# Altium footprint library WR-TBL_Pluggable PCB Header.PcbLib: 719 footprints (part 14 of 45)
Each footprint in its own frame and in the unit in brackets; x right, y up, seen from the top. Pads: shape width x height; smd on the part's side, far side on the other; paste and mask are expansions set on the pad; w line width, h text height; cw(c..) or ccw(c..) is an arc to the next point about the centre after c.
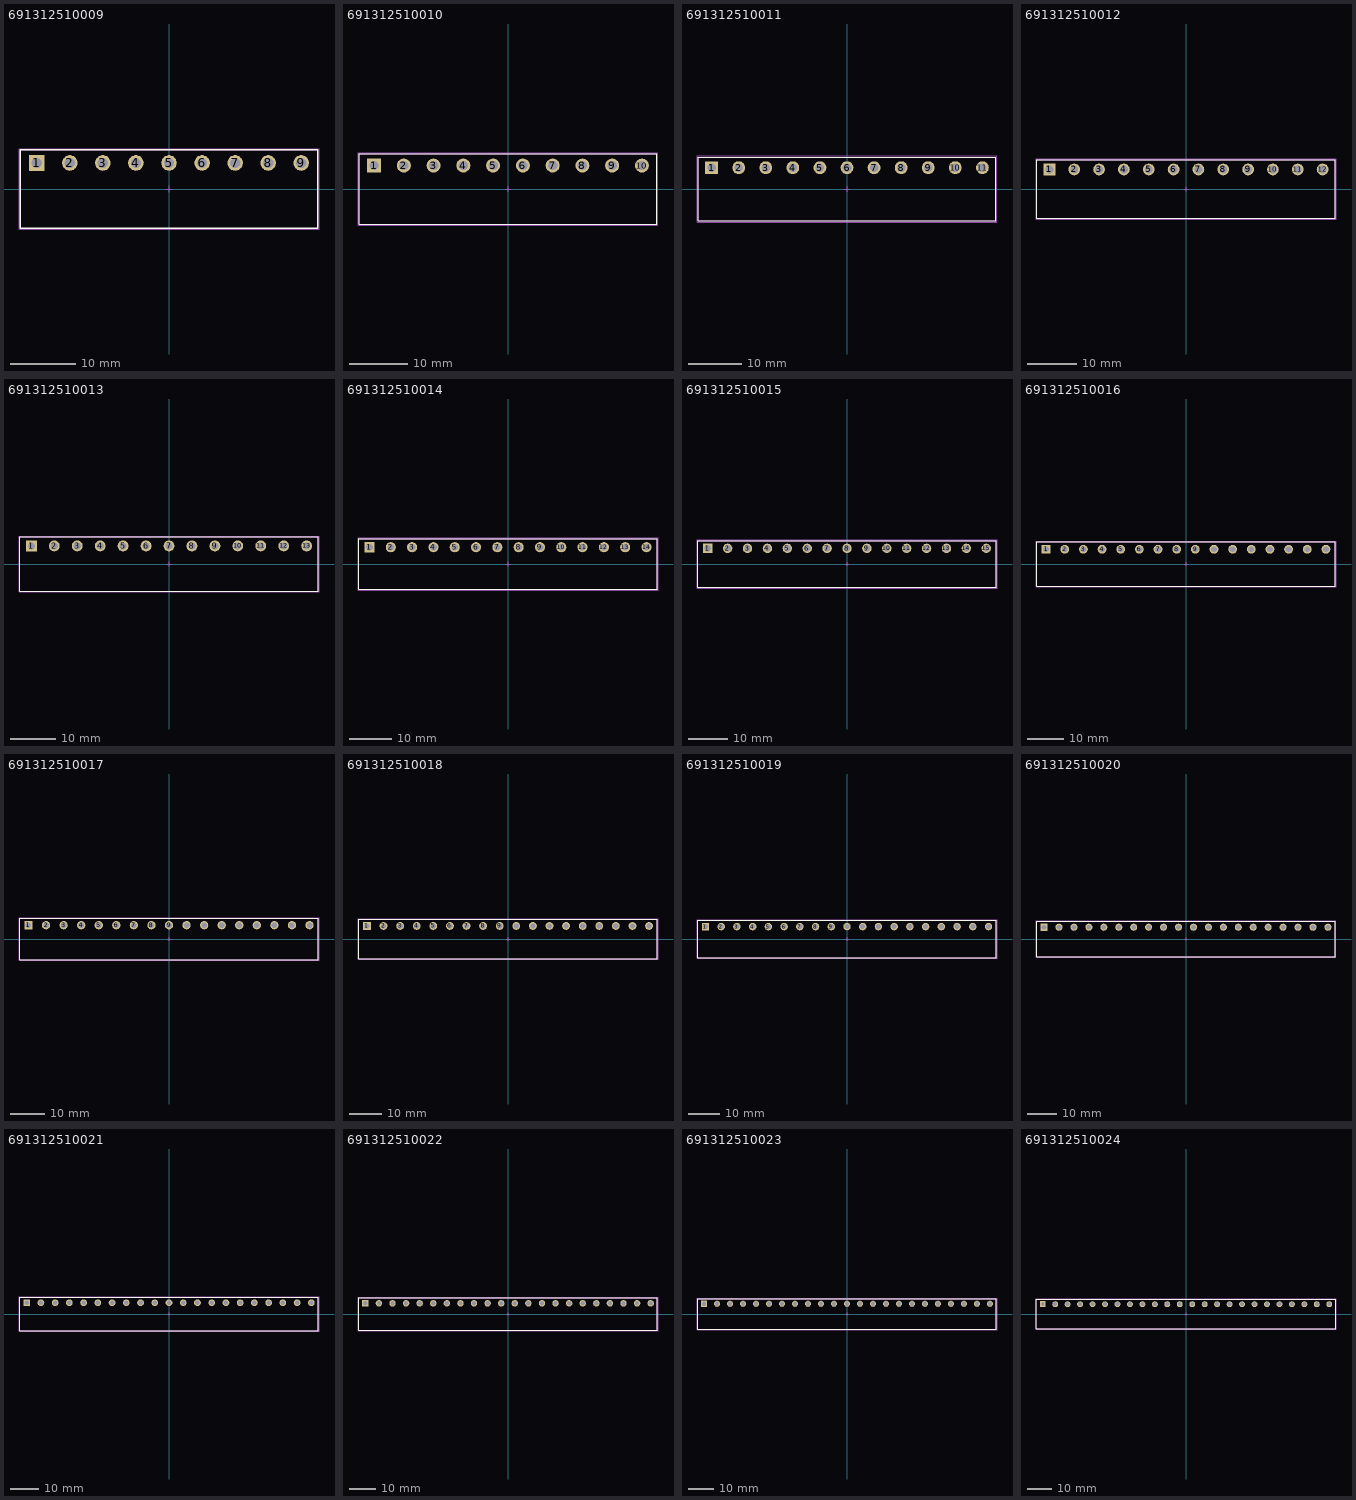
[diagram p13: the footprints below, top view; thin cyan lines are the x and y axes]

## 691312510009 [mm] "5,08mm - PCB Headers - Horizontal - Opened ends - 09p"
height 8.5
pads (9):
  rect 2.4x2.4 hole 1.6: 1(-20.32,4)
  round 2.4 hole 1.6: 2(-15.24,4) 3(-10.16,4) 4(-5.08,4) 5(0,4) 6(5.08,4) 7(10.16,4) 8(15.24,4) 9(20.32,4)
Top Overlay:
  lines w0.2: -22.86,-6 -22.86,6 22.86,6 22.86,-6 -22.86,-6
Mechanical 13:
  lines w0.1: -22.86,-6 22.86,-6 22.86,6 -22.86,6 -22.86,-6
Mechanical 15:
  lines w0.05: -0.5,0 0.5,0 ; 0,-0.5 0,0.5 ; -23.06,-6.2 -23.06,6.2 23.06,6.2 23.06,-6.2 -23.06,-6.2
3D body "691312510009.stp": height 8.55, standoff -3.45, extent -22.86,-6 22.86,6

## 691312510010 [mm] "5,08mm - PCB Headers - Horizontal - Opened ends - 10p"
height 8.5
pads (10):
  rect 2.4x2.4 hole 1.6: 1(-22.86,4)
  round 2.4 hole 1.6: 2(-17.78,4) 3(-12.7,4) 4(-7.62,4) 5(-2.54,4) 6(2.54,4) 7(7.62,4) 8(12.7,4) 9(17.78,4) 10(22.86,4)
Top Overlay:
  lines w0.2: -25.4,-6 25.4,-6 25.4,6 -25.4,6 -25.4,-6
Mechanical 13:
  lines w0.1: -25.4,-6 -25.4,6 25.4,6 25.4,-6 -25.4,-6
Mechanical 15:
  lines w0.05: -0.5,0 0.5,0 ; 0,-0.5 0,0.5 ; -25.6,-6.2 25.6,-6.2 25.6,6.2 -25.6,6.2 -25.6,-6.2
3D body "691312510010.stp": height 8.55, standoff -3.45, extent -25.4,-6 25.4,6

## 691312510011 [mm] "5,08mm - PCB Headers - Horizontal - Opened ends - 11p"
height 8.5
pads (11):
  rect 2.4x2.4 hole 1.6: 1(-25.4,4)
  round 2.4 hole 1.6: 2(-20.32,4) 3(-15.24,4) 4(-10.16,4) 5(-5.08,4) 6(0,4) 7(5.08,4) 8(10.16,4) 9(15.24,4) 10(20.32,4) 11(25.4,4)
Top Overlay:
  lines w0.2: -27.94,-6 27.94,-6 27.94,6 -27.94,6 -27.94,-6
Mechanical 13:
  lines w0.1: -27.94,-6 -27.94,6 27.94,6 27.94,-6 -27.94,-6
Mechanical 15:
  lines w0.05: -0.5,0 0.5,0 ; 0,-0.5 0,0.5 ; -28.14,-6.2 28.14,-6.2 28.14,6.2 -28.14,6.2 -28.14,-6.2
3D body "691312510011.stp": height 8.55, standoff -3.45, extent -27.94,-6 27.94,6

## 691312510012 [mm] "5,08mm - PCB Headers - Horizontal - Opened ends - 12p"
height 8.5
pads (12):
  rect 2.4x2.4 hole 1.6: 1(-27.94,4)
  round 2.4 hole 1.6: 2(-22.86,4) 3(-17.78,4) 4(-12.7,4) 5(-7.62,4) 6(-2.54,4) 7(2.54,4) 8(7.62,4) 9(12.7,4) 10(17.78,4) 11(22.86,4) 12(27.94,4)
Top Overlay:
  lines w0.2: -30.48,-6 -30.48,6 30.48,6 30.48,-6 -30.48,-6
Mechanical 13:
  lines w0.1: -30.48,-6 30.48,-6 30.48,6 -30.48,6 -30.48,-6
Mechanical 15:
  lines w0.05: -0.5,0 0.5,0 ; 0,-0.5 0,0.5 ; -30.68,-6.2 -30.68,6.2 30.68,6.2 30.68,-6.2 -30.68,-6.2
3D body "691312510012.stp": height 8.55, standoff -3.45, extent -30.48,-6 30.48,6

## 691312510013 [mm] "5,08mm - PCB Headers - Horizontal - Opened ends - 13p"
height 8.5
pads (13):
  rect 2.4x2.4 hole 1.6: 1(-30.48,4)
  round 2.4 hole 1.6: 2(-25.4,4) 3(-20.32,4) 4(-15.24,4) 5(-10.16,4) 6(-5.08,4) 7(0,4) 8(5.08,4) 9(10.16,4) 10(15.24,4) 11(20.32,4) 12(25.4,4) 13(30.48,4)
Top Overlay:
  lines w0.2: -33.02,-6 33.02,-6 33.02,6 -33.02,6 -33.02,-6
Mechanical 13:
  lines w0.1: -33.02,-6 -33.02,6 33.02,6 33.02,-6 -33.02,-6
Mechanical 15:
  lines w0.05: -0.5,0 0.5,0 ; 0,-0.5 0,0.5 ; -33.22,-6.2 33.22,-6.2 33.22,6.2 -33.22,6.2 -33.22,-6.2
3D body "691312510013.stp": height 8.55, standoff -3.45, extent -33.02,-6 33.02,6

## 691312510014 [mm] "5,08mm - PCB Headers - Horizontal - Opened ends - 14p"
height 8.5
pads (14):
  rect 2.4x2.4 hole 1.6: 1(-33.02,4)
  round 2.4 hole 1.6: 2(-27.94,4) 3(-22.86,4) 4(-17.78,4) 5(-12.7,4) 6(-7.62,4) 7(-2.54,4) 8(2.54,4) 9(7.62,4) 10(12.7,4) 11(17.78,4) 12(22.86,4) 13(27.94,4) 14(33.02,4)
Top Overlay:
  lines w0.2: -35.56,-6 -35.56,6 35.56,6 35.56,-6 -35.56,-6
Mechanical 13:
  lines w0.1: -35.56,-6 35.56,-6 35.56,6 -35.56,6 -35.56,-6
Mechanical 15:
  lines w0.05: -0.5,0 0.5,0 ; 0,-0.5 0,0.5 ; -35.76,-6.2 -35.76,6.2 35.76,6.2 35.76,-6.2 -35.76,-6.2
3D body "691312510014.stp": height 8.55, standoff -3.45, extent -35.56,-6 35.56,6

## 691312510015 [mm] "5,08mm - PCB Headers - Horizontal - Opened ends - 15p"
height 8.5
pads (15):
  rect 2.4x2.4 hole 1.6: 1(-35.56,4)
  round 2.4 hole 1.6: 2(-30.48,4) 3(-25.4,4) 4(-20.32,4) 5(-15.24,4) 6(-10.16,4) 7(-5.08,4) 8(0,4) 9(5.08,4) 10(10.16,4) 11(15.24,4) 12(20.32,4) 13(25.4,4) 14(30.48,4) 15(35.56,4)
Top Overlay:
  lines w0.2: -38.1,-6 38.1,-6 38.1,6 -38.1,6 -38.1,-6
Mechanical 13:
  lines w0.1: -38.1,-6 -38.1,6 38.1,6 38.1,-6 -38.1,-6
Mechanical 15:
  lines w0.05: -0.5,0 0.5,0 ; 0,-0.5 0,0.5 ; -38.3,-6.2 38.3,-6.2 38.3,6.2 -38.3,6.2 -38.3,-6.2
3D body "691312510015.stp": height 8.55, standoff -3.45, extent -38.1,-6 38.1,6

## 691312510016 [mm] "5,08mm - PCB Headers - Horizontal - Opened ends - 16p"
height 8.5
pads (16):
  rect 2.4x2.4 hole 1.6: 1(-38.1,4)
  round 2.4 hole 1.6: 2(-33.02,4) 3(-27.94,4) 4(-22.86,4) 5(-17.78,4) 6(-12.7,4) 7(-7.62,4) 8(-2.54,4) 9(2.54,4) 10(7.62,4) 11(12.7,4) 12(17.78,4) 13(22.86,4) 14(27.94,4) 15(33.02,4) 16(38.1,4)
Top Overlay:
  lines w0.2: -40.64,-6 40.64,-6 40.64,6 -40.64,6 -40.64,-6
Mechanical 13:
  lines w0.1: -40.64,-6 -40.64,6 40.64,6 40.64,-6 -40.64,-6
Mechanical 15:
  lines w0.05: -0.5,0 0.5,0 ; 0,-0.5 0,0.5 ; -40.84,-6.2 40.84,-6.2 40.84,6.2 -40.84,6.2 -40.84,-6.2
3D body "691312510016.stp": height 8.55, standoff -3.45, extent -40.64,-6 40.64,6

## 691312510017 [mm] "5,08mm - PCB Headers - Horizontal - Opened ends - 17p"
height 8.5
pads (17):
  rect 2.4x2.4 hole 1.6: 1(-40.64,4)
  round 2.4 hole 1.6: 2(-35.56,4) 3(-30.48,4) 4(-25.4,4) 5(-20.32,4) 6(-15.24,4) 7(-10.16,4) 8(-5.08,4) 9(0,4) 10(5.08,4) 11(10.16,4) 12(15.24,4) 13(20.32,4) 14(25.4,4) 15(30.48,4) 16(35.56,4) 17(40.64,4)
Top Overlay:
  lines w0.2: -43.18,-6 -43.18,6 43.18,6 43.18,-6 -43.18,-6
Mechanical 13:
  lines w0.1: -43.18,-6 43.18,-6 43.18,6 -43.18,6 -43.18,-6
Mechanical 15:
  lines w0.05: -0.5,0 0.5,0 ; 0,-0.5 0,0.5 ; -43.38,-6.2 -43.38,6.2 43.38,6.2 43.38,-6.2 -43.38,-6.2
3D body "691312510017.stp": height 8.55, standoff -3.45, extent -43.18,-6 43.18,6

## 691312510018 [mm] "5,08mm - PCB Headers - Horizontal - Opened ends - 18p"
height 8.5
pads (18):
  rect 2.4x2.4 hole 1.6: 1(-43.18,4)
  round 2.4 hole 1.6: 2(-38.1,4) 3(-33.02,4) 4(-27.94,4) 5(-22.86,4) 6(-17.78,4) 7(-12.7,4) 8(-7.62,4) 9(-2.54,4) 10(2.54,4) 11(7.62,4) 12(12.7,4) 13(17.78,4) 14(22.86,4) 15(27.94,4) 16(33.02,4) 17(38.1,4) 18(43.18,4)
Top Overlay:
  lines w0.2: -45.72,-6 45.72,-6 45.72,6 -45.72,6 -45.72,-6
Mechanical 13:
  lines w0.1: -45.72,-6 -45.72,6 45.72,6 45.72,-6 -45.72,-6
Mechanical 15:
  lines w0.05: -0.5,0 0.5,0 ; 0,-0.5 0,0.5 ; -45.92,-6.2 45.92,-6.2 45.92,6.2 -45.92,6.2 -45.92,-6.2
3D body "691312510018.stp": height 8.55, standoff -3.45, extent -45.72,-6 45.72,6

## 691312510019 [mm] "5,08mm - PCB Headers - Horizontal - Opened ends - 19p"
height 8.5
pads (19):
  rect 2.4x2.4 hole 1.6: 1(-45.72,4)
  round 2.4 hole 1.6: 2(-40.64,4) 3(-35.56,4) 4(-30.48,4) 5(-25.4,4) 6(-20.32,4) 7(-15.24,4) 8(-10.16,4) 9(-5.08,4) 10(0,4) 11(5.08,4) 12(10.16,4) 13(15.24,4) 14(20.32,4) 15(25.4,4) 16(30.48,4) 17(35.56,4) 18(40.64,4) 19(45.72,4)
Top Overlay:
  lines w0.2: -48.26,-6 48.26,-6 48.26,6 -48.26,6 -48.26,-6
Mechanical 13:
  lines w0.1: -48.26,-6 -48.26,6 48.26,6 48.26,-6 -48.26,-6
Mechanical 15:
  lines w0.05: -0.5,0 0.5,0 ; 0,-0.5 0,0.5 ; -48.46,-6.2 48.46,-6.2 48.46,6.2 -48.46,6.2 -48.46,-6.2
3D body "691312510019.stp": height 8.55, standoff -3.45, extent -48.26,-6 48.26,6

## 691312510020 [mm] "5,08mm - PCB Headers - Horizontal - Opened ends - 20p"
height 8.5
pads (20):
  rect 2.4x2.4 hole 1.6: 1(-48.26,4)
  round 2.4 hole 1.6: 2(-43.18,4) 3(-38.1,4) 4(-33.02,4) 5(-27.94,4) 6(-22.86,4) 7(-17.78,4) 8(-12.7,4) 9(-7.62,4) 10(-2.54,4) 11(2.54,4) 12(7.62,4) 13(12.7,4) 14(17.78,4) 15(22.86,4) 16(27.94,4) 17(33.02,4) 18(38.1,4) 19(43.18,4) 20(48.26,4)
Top Overlay:
  lines w0.2: -50.8,-6 -50.8,6 50.8,6 50.8,-6 -50.8,-6
Mechanical 13:
  lines w0.1: -50.8,-6 50.8,-6 50.8,6 -50.8,6 -50.8,-6
Mechanical 15:
  lines w0.05: -0.5,0 0.5,0 ; 0,-0.5 0,0.5 ; -51,-6.2 -51,6.2 51,6.2 51,-6.2 -51,-6.2
3D body "691312510020.stp": height 8.55, standoff -3.45, extent -50.8,-6 50.8,6

## 691312510021 [mm] "5,08mm - PCB Headers - Horizontal - Opened ends - 21p"
height 8.5
pads (21):
  rect 2.4x2.4 hole 1.6: 1(-50.8,4)
  round 2.4 hole 1.6: 2(-45.72,4) 3(-40.64,4) 4(-35.56,4) 5(-30.48,4) 6(-25.4,4) 7(-20.32,4) 8(-15.24,4) 9(-10.16,4) 10(-5.08,4) 11(0,4) 12(5.08,4) 13(10.16,4) 14(15.24,4) 15(20.32,4) 16(25.4,4) 17(30.48,4) 18(35.56,4) 19(40.64,4) 20(45.72,4) 21(50.8,4)
Top Overlay:
  lines w0.2: -53.34,-6 53.34,-6 53.34,6 -53.34,6 -53.34,-6
Mechanical 13:
  lines w0.1: -53.34,-6 -53.34,6 53.34,6 53.34,-6 -53.34,-6
Mechanical 15:
  lines w0.05: -0.5,0 0.5,0 ; 0,-0.5 0,0.5 ; -53.54,-6.2 53.54,-6.2 53.54,6.2 -53.54,6.2 -53.54,-6.2
3D body "691312510021.stp": height 8.55, standoff -3.45, extent -53.34,-6 53.34,6

## 691312510022 [mm] "5,08mm - PCB Headers - Horizontal - Opened ends - 22p"
height 8.5
pads (22):
  rect 2.4x2.4 hole 1.6: 1(-53.34,4)
  round 2.4 hole 1.6: 2(-48.26,4) 3(-43.18,4) 4(-38.1,4) 5(-33.02,4) 6(-27.94,4) 7(-22.86,4) 8(-17.78,4) 9(-12.7,4) 10(-7.62,4) 11(-2.54,4) 12(2.54,4) 13(7.62,4) 14(12.7,4) 15(17.78,4) 16(22.86,4) 17(27.94,4) 18(33.02,4) 19(38.1,4) 20(43.18,4) 21(48.26,4) 22(53.34,4)
Top Overlay:
  lines w0.2: -55.88,-6 -55.88,6 55.88,6 55.88,-6 -55.88,-6
Mechanical 13:
  lines w0.1: -55.88,-6 55.88,-6 55.88,6 -55.88,6 -55.88,-6
Mechanical 15:
  lines w0.05: -0.5,0 0.5,0 ; 0,-0.5 0,0.5 ; -56.08,-6.2 -56.08,6.2 56.08,6.2 56.08,-6.2 -56.08,-6.2
3D body "691312510022.stp": height 8.55, standoff -3.45, extent -55.88,-6 55.88,6

## 691312510023 [mm] "5,08mm - PCB Headers - Horizontal - Opened ends - 23p"
height 8.5
pads (23):
  rect 2.4x2.4 hole 1.6: 1(-55.88,4)
  round 2.4 hole 1.6: 2(-50.8,4) 3(-45.72,4) 4(-40.64,4) 5(-35.56,4) 6(-30.48,4) 7(-25.4,4) 8(-20.32,4) 9(-15.24,4) 10(-10.16,4) 11(-5.08,4) 12(0,4) 13(5.08,4) 14(10.16,4) 15(15.24,4) 16(20.32,4) 17(25.4,4) 18(30.48,4) 19(35.56,4) 20(40.64,4) 21(45.72,4) 22(50.8,4) 23(55.88,4)
Top Overlay:
  lines w0.2: -58.42,-6 58.42,-6 58.42,6 -58.42,6 -58.42,-6
Mechanical 13:
  lines w0.1: -58.42,-6 -58.42,6 58.42,6 58.42,-6 -58.42,-6
Mechanical 15:
  lines w0.05: -0.5,0 0.5,0 ; 0,-0.5 0,0.5 ; -58.62,-6.2 58.62,-6.2 58.62,6.2 -58.62,6.2 -58.62,-6.2
3D body "691312510023.stp": height 8.55, standoff -3.45, extent -58.42,-6 58.42,6

## 691312510024 [mm] "5,08mm - PCB Headers - Horizontal - Opened ends - 24p"
height 8.5
pads (24):
  rect 2.4x2.4 hole 1.6: 1(-58.42,4)
  round 2.4 hole 1.6: 2(-53.34,4) 3(-48.26,4) 4(-43.18,4) 5(-38.1,4) 6(-33.02,4) 7(-27.94,4) 8(-22.86,4) 9(-17.78,4) 10(-12.7,4) 11(-7.62,4) 12(-2.54,4) 13(2.54,4) 14(7.62,4) 15(12.7,4) 16(17.78,4) 17(22.86,4) 18(27.94,4) 19(33.02,4) 20(38.1,4) 21(43.18,4) 22(48.26,4) 23(53.34,4) 24(58.42,4)
Top Overlay:
  lines w0.2: -60.96,-6 -60.96,6 60.96,6 60.96,-6 -60.96,-6
Mechanical 13:
  lines w0.1: -60.96,-6 60.96,-6 60.96,6 -60.96,6 -60.96,-6
Mechanical 15:
  lines w0.05: -0.5,0 0.5,0 ; 0,-0.5 0,0.5 ; -61.16,-6.2 -61.16,6.2 61.16,6.2 61.16,-6.2 -61.16,-6.2
3D body "691312510024.stp": height 8.55, standoff -3.45, extent -60.96,-6 60.96,6